# Altium footprint library GIGABLOX_NANO_SWITCH_REVA_MODULE.PcbLib: 1 footprints
Each footprint in its own frame and in the unit in brackets; x right, y up, seen from the top. Pads: shape width x height; smd on the part's side, far side on the other; paste and mask are expansions set on the pad; w line width, h text height; cw(c..) or ccw(c..) is an arc to the next point about the centre after c.
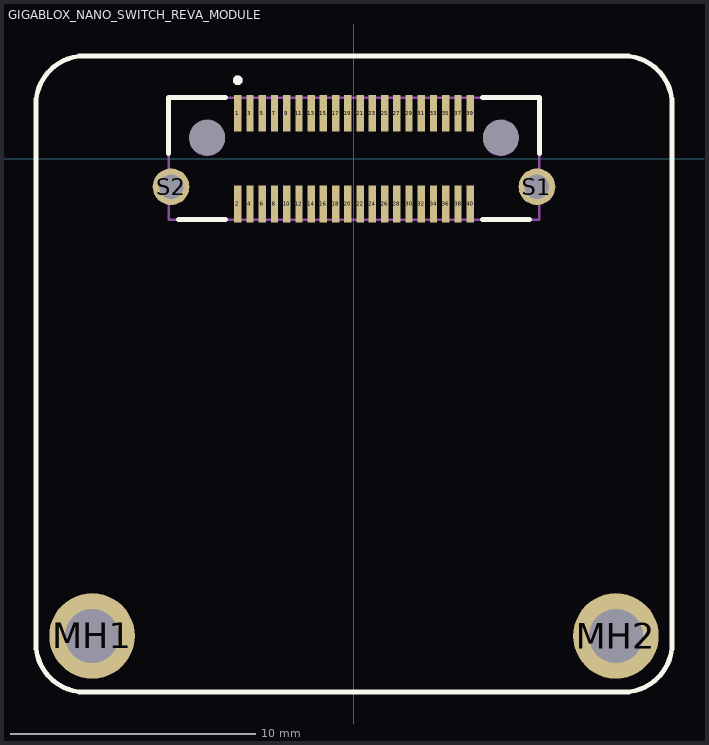
[diagram p0: the footprint, top view; thin cyan lines are the x and y axes]

## GIGABLOX_NANO_SWITCH_REVA_MODULE [mm]
height 3.95
pads (46):
  rect 0.3x1.5 smd mask+0.05: 1(-4.75,1.85) 2(-4.75,-1.85) 3(-4.25,1.85) 4(-4.25,-1.85) 5(-3.75,1.85) 6(-3.75,-1.85) 7(-3.25,1.85) 8(-3.25,-1.85) 9(-2.75,1.85) 10(-2.75,-1.85) 11(-2.25,1.85) 12(-2.25,-1.85) 13(-1.75,1.85) 14(-1.75,-1.85) 15(-1.25,1.85) 16(-1.25,-1.85) 17(-0.75,1.85) 18(-0.75,-1.85) 19(-0.25,1.85) 20(-0.25,-1.85) 21(0.25,1.85) 22(0.25,-1.85) 23(0.75,1.85) 24(0.75,-1.85) 25(1.25,1.85) 26(1.25,-1.85) 27(1.75,1.85) 28(1.75,-1.85) 29(2.25,1.85) 30(2.25,-1.85) 31(2.75,1.85) 32(2.75,-1.85) 33(3.25,1.85) 34(3.25,-1.85) 35(3.75,1.85) 36(3.75,-1.85) 37(4.25,1.85) 38(4.25,-1.85) 39(4.75,1.85) 40(4.75,-1.85)
  round 3.5 hole 2.2: MH1(-10.7,-19.5) MH2(10.7,-19.5)
  round 1.5 hole 1: S1(7.475,-1.15) S2(-7.475,-1.15)
  round 1.45 hole 1.45 unplated: ""(-6,0.85) ""(6,0.85)
Top Overlay:
  circle w0.2: c-4.75,3.2 r0.1
  lines w0.2: -7.575,0.2 -7.575,2.49 -5.25,2.49 ; -7.175,-2.49 -5.25,-2.49 ; 5.25,-2.49 7.175,-2.49 ; 5.25,2.49 7.575,2.49 7.575,0.2 ; -13,-19.8 ccw(c-11,-19.8) -11,-21.8 11,-21.8 ccw(c11,-19.8) 13,-19.8 13,2.2 ccw(c11,2.2) 11,4.2 -11,4.2 ccw(c-11,2.2) -13,2.2 -13,-19.8
Top Paste:
  region: -6.475,-1.15 -6.475,-1.052 -6.513,-0.858 -6.589,-0.676 -6.698,-0.513 -6.838,-0.373 -7.001,-0.264 -7.183,-0.188 -7.377,-0.15 -7.475,-0.15 -7.573,-0.15 -7.767,-0.188 -7.949,-0.264 -8.112,-0.373 -8.252,-0.513 -8.361,-0.676 -8.437,-0.858 -8.475,-1.052 -8.475,-1.15 -8.475,-1.249 -8.437,-1.442 -8.361,-1.624 -8.252,-1.787 -8.112,-1.927 -7.949,-2.036 -7.767,-2.112 -7.573,-2.15 -7.475,-2.15 -7.377,-2.15 -7.183,-2.112 -7.001,-2.036 -6.838,-1.927 -6.698,-1.787 -6.589,-1.624 -6.513,-1.442 -6.475,-1.249
  region: 8.475,-1.15 8.475,-1.052 8.437,-0.858 8.361,-0.676 8.252,-0.513 8.112,-0.373 7.949,-0.264 7.767,-0.188 7.573,-0.15 7.475,-0.15 7.377,-0.15 7.183,-0.188 7.001,-0.264 6.838,-0.373 6.698,-0.513 6.589,-0.676 6.513,-0.858 6.475,-1.052 6.475,-1.15 6.475,-1.249 6.513,-1.442 6.589,-1.624 6.698,-1.787 6.838,-1.927 7.001,-2.036 7.183,-2.112 7.377,-2.15 7.475,-2.15 7.573,-2.15 7.767,-2.112 7.949,-2.036 8.112,-1.927 8.252,-1.787 8.361,-1.624 8.437,-1.442 8.475,-1.249
Mechanical 2:
  circle w0.013: c-6,0.85 r0.516
  circle w0.013: c-6,0.85 r0.66
  circle w0.013: c-6,0.85 r0.725
  circle w0.013: c6,0.85 r0.725
  circle w0.013: c-7.475,-1.15 r0.5
  circle w0.013: c7.475,-1.15 r0.5
  circle w0.013: c10.7,-19.5 r1.1
  circle w0.013: c-10.7,-19.5 r1.1
  lines w0.013: -7.575,-1.64 -7.575,-0.66 ; -7.575,-1.55 -7.375,-1.55 -7.375,-0.75 -7.575,-0.75 ; 7.575,-1.64 7.575,-0.66 ; 7.575,-1.55 7.375,-1.55 7.375,-0.75 7.575,-0.75 ; 5.45,0.74 ccw(c6,0.74) 6.55,0.74 ; 5.45,0.74 5.594,0.74 ; 5.45,0.74 5.45,0.96 ; 5.45,0.96 cw(c6,0.96) 6.55,0.96 ; 5.45,0.96 5.594,0.96 ; 5.594,0.74 ccw(c6,0.74) 6.406,0.74 ; 5.594,0.74 5.594,0.96 ; 5.594,0.96 cw(c6,0.96) 6.406,0.96 ; 6.406,0.74 6.55,0.74 ; 6.406,0.74 6.406,0.96 ; 6.406,0.96 6.55,0.96 ; 6.55,0.74 6.55,0.96
Mechanical 13:
  circle w0.2: c-4.75,3.2 r0.1
  lines w0.1: -7.575,-2.49 7.575,-2.49 7.575,2.49 -7.575,2.49 -7.575,-2.49
3D body "LSHM-120-02.5-L-DV-A-S-K-TR_MODULE.stp": height 8.76, standoff -1.68, extent -13,-21.8 13,4.2